# Altium footprint library Connectors SMD.PcbLib: 130 footprints (part 2 of 12) (continued)
## ERNI_294139 [mm] "50 Contacts Pitch 0.8  SMT Vertical Male Connector Type MicroCon"
height 4.8
pads (54):
  rect 0.55x2.35 smd: A1(9.6,-1.325) A2(8.8,-1.325) A3(8,-1.325) A4(7.2,-1.325) A5(6.4,-1.325) A6(5.6,-1.325) A7(4.8,-1.325) A8(4,-1.325) A9(3.2,-1.325) A10(2.4,-1.325) A11(1.6,-1.325) A12(0.8,-1.325) A13(0,-1.325) A14(-0.8,-1.325) A15(-1.6,-1.325) A16(-2.4,-1.325) A17(-3.2,-1.325) A18(-4,-1.325) A19(-4.8,-1.325) A20(-5.6,-1.325) A21(-6.4,-1.325) A22(-7.2,-1.325) A23(-8,-1.325) A24(-8.8,-1.325) A25(-9.6,-1.325) B1(9.6,1.325) B2(8.8,1.325) B3(8,1.325) B4(7.2,1.325) B5(6.4,1.325) B6(5.6,1.325) B7(4.8,1.325) B8(4,1.325) B9(3.2,1.325) B10(2.4,1.325) B11(1.6,1.325) B12(0.8,1.325) B13(0,1.325) B14(-0.8,1.325) B15(-1.6,1.325) B16(-2.4,1.325) B17(-3.2,1.325) B18(-4,1.325) B19(-4.8,1.325) B20(-5.6,1.325) B21(-6.4,1.325) B22(-7.2,1.325) B23(-8,1.325) B24(-8.8,1.325) B25(-9.6,1.325)
  rect 0.6x0.6 smd: MEC1(-11.8,0) MEC2(11.8,0)
  round 0.5 hole 0.8 unplated mask+0.15: Mec5(10.6,-0.625)
  round 0.5 hole 1 unplated mask+0.25: Mec6(-10.6,-0.625)
Top Layer:
  region: -12.1,-2.5 -10.75,-2.5 -10.75,-1.513 -10.835,-1.502 -11.054,-1.411 -11.242,-1.267 -11.386,-1.079 -11.477,-0.86 -11.508,-0.625 -11.477,-0.39 -11.386,-0.171 -11.242,0.017 -11.054,0.161 -10.835,0.252 -10.75,0.263 -10.75,0.262 -10.75,2.5 -12.1,2.5
  region: 10.75,-2.5 12.1,-2.5 12.1,2.5 10.75,2.5 10.75,0.263 10.835,0.252 11.054,0.161 11.242,0.017 11.386,-0.171 11.477,-0.39 11.508,-0.625 11.477,-0.86 11.386,-1.079 11.242,-1.267 11.054,-1.411 10.835,-1.502 10.75,-1.513 10.75,-1.512
Top Overlay:
  circle w0.25: c9.625,-3.101 r0.125
  text "a" at 12.525,-1.705 h1
  text "b" at 12.55,1 h1
Mechanical 8:
  drawing of 377 lines, arcs and shapes, not listed
Mechanical 14:
  drawing of 256 lines, arcs and shapes, not listed
  text "a" at 12.525,-1.705 h1
  text "b" at 12.55,1 h1
Mechanical 15:
  lines w0.05: -12.35,-2.75 -12.35,2.75 12.35,2.75 12.35,-2.75 -12.35,-2.75
3D body: height 4.8, standoff -0.7, extent -12.1,-2.5 12.1,2.5

## FCI_10030570-2112LF [mm] "26 Contacts, Pitch 1mm, Surface Mount Card Edge ExpressCard Module Connector"
height 2.13
pads (26):
  rect 0.7x2 smd: 1(12.5,0) 2(11.5,0) 3(10.5,0) 4(9.5,0) 5(8.5,0) 6(7.5,0) 7(6.5,0) 8(5.5,0) 9(4.5,0) 10(3.5,0) 11(2.5,0) 12(1.5,0) 13(0.5,0) 14(-0.5,0) 15(-1.5,0) 16(-2.5,0) 17(-3.5,0) 18(-4.5,0) 19(-5.5,0) 20(-6.5,0) 21(-7.5,0) 22(-8.5,0) 23(-9.5,0) 24(-10.5,0) 25(-11.5,0) 26(-12.5,0)
Top Overlay:
  circle w0.25: c12.5,1.8 r0.125
  lines w0.2: -15.55,-7.25 -12.55,-7.25 -12.55,-7.95 ccw(c-12.25,-7.95) -12.25,-8.25 12.25,-8.25 ccw(c12.25,-7.95) 12.55,-7.95 12.55,-7.25 15.55,-7.25 ; -15.55,0.75 -15.55,-0.5 ; -15.15,-7.25 -15.15,-6 ; -15.15,-0.5 -15.15,0.75 ; -14.935,-10.25 cw(c-14.935,-10.05) -15.108,-10.15 -15.5,-9.471 cw(c-15.161,-9.278) -15.55,-9.25 -15.55,-6 ; -13.5,-2.65 13.5,-2.65 ; -12.55,-7.75 12.55,-7.75 ; -11.4,-2.15 -11.4,-3.15 -13.5,-3.15 -13.5,-1 ; -10.6,-2.15 -10.6,-3.15 10.6,-3.15 10.6,-2.15 ; 11.4,-2.15 11.4,-3.15 13.5,-3.15 13.5,-1 ; 14.935,-10.25 ccw(c14.935,-10.05) 15.108,-10.15 15.5,-9.471 ccw(c15.161,-9.278) 15.55,-9.25 15.55,-6 ; 15.15,-7.25 15.15,-6 ; 15.15,-0.5 15.15,0.75 ; 15.55,0.75 15.55,-0.5 ; -15.55,-6 -14.7,-6 -14.7,-0.5 -15.55,-0.5 ; -15.55,-6 -15.55,-0.5 ; -13.5,-1 ccw(c-13.25,-1) -13.25,-1.25 -13.2,-1.25 -13.2,-2.15 13.2,-2.15 13.2,-1.25 13.25,-1.25 ccw(c13.25,-1) 13.5,-1 ; -13.5,-1 -13.5,0.75 -17,0.75 -17,-9.33 ccw(c-16.8,-9.33) -16.973,-9.43 -16.558,-10.15 ccw(c-16.385,-10.05) -16.385,-10.25 16.385,-10.25 ccw(c16.385,-10.05) 16.558,-10.15 16.973,-9.43 ccw(c16.8,-9.33) 17,-9.33 17,0.75 13.5,0.75 13.5,-1 ; 15.55,-6 15.55,-0.5 ; 15.55,-6 14.7,-6 14.7,-0.5 15.55,-0.5
Keep-Out Layer:
  board cut-out: -19.55,-10.5 -19.55,1 -15.2,1 -15.2,-7.05 -14.3,-7.05 -14.3,-1.85 -14.312,-1.85 -14.265,-1.616 -14.133,-1.417 -13.934,-1.285 -13.7,-1.238 -13.7,-1.25 13.7,-1.238 13.934,-1.285 14.133,-1.417 14.265,-1.616 14.312,-1.85 14.3,-1.85 14.3,-7.05 15.2,-7.05 15.2,1 19.55,1 19.55,-10.5
Mechanical 1:
  lines w0.635: -15.2,1 -15.2,-7.05 -14.3,-7.05 -14.3,-1.85 cw(c-13.7,-1.85) -13.7,-1.25 13.7,-1.25 cw(c13.7,-1.85) 14.3,-1.85 14.3,-7.05 15.2,-7.05 15.2,1
Mechanical 8:
  drawing of 186 lines, arcs and shapes, not listed
Mechanical 14:
  lines w0.1: -15.55,-7.25 -12.55,-7.25 -12.55,-7.95 ccw(c-12.25,-7.95) -12.25,-8.25 12.25,-8.25 ccw(c12.25,-7.95) 12.55,-7.95 12.55,-7.25 15.55,-7.25 ; -15.55,0.75 -15.55,-0.5 ; -15.15,-7.25 -15.15,-6 ; -15.15,-0.5 -15.15,0.75 ; -14.935,-10.25 cw(c-14.935,-10.05) -15.108,-10.15 -15.5,-9.471 cw(c-15.161,-9.278) -15.55,-9.25 -15.55,-6 ; -13.5,-2.65 13.5,-2.65 ; -12.55,-7.75 12.55,-7.75 ; -11.4,-2.15 -11.4,-3.15 -13.5,-3.15 -13.5,-1 ; -10.6,-2.15 -10.6,-3.15 10.6,-3.15 10.6,-2.15 ; 11.4,-2.15 11.4,-3.15 13.5,-3.15 13.5,-1 ; 14.935,-10.25 ccw(c14.935,-10.05) 15.108,-10.15 15.5,-9.471 ccw(c15.161,-9.278) 15.55,-9.25 15.55,-6 ; 15.15,-7.25 15.15,-6 ; 15.15,-0.5 15.15,0.75 ; 15.55,0.75 15.55,-0.5 ; -15.55,-6 -14.7,-6 -14.7,-0.5 -15.55,-0.5 ; -15.55,-6 -15.55,-0.5 ; -13.5,-1 ccw(c-13.25,-1) -13.25,-1.25 -13.2,-1.25 -13.2,-2.15 13.2,-2.15 13.2,-1.25 13.25,-1.25 ccw(c13.25,-1) 13.5,-1 ; -13.5,-1 -13.5,0.75 -17,0.75 -17,-9.33 ccw(c-16.8,-9.33) -16.973,-9.43 -16.558,-10.15 ccw(c-16.385,-10.05) -16.385,-10.25 16.385,-10.25 ccw(c16.385,-10.05) 16.558,-10.15 16.973,-9.43 ccw(c16.8,-9.33) 17,-9.33 17,0.75 13.5,0.75 13.5,-1 ; 15.55,-6 15.55,-0.5 ; 15.55,-6 14.7,-6 14.7,-0.5 15.55,-0.5
Mechanical 15:
  lines w0.05: -17.25,-10.5 -17.25,1.25 17.25,1.25 17.25,-10.5 -17.25,-10.5
Drill Drawing:
  lines w0.1: -15.2,0 -15.2,2 ; -14.3,-5.45 -14.3,-3.45 ; -14.26,0.658 -15.2,1 ; -14.26,1.342 -15.2,1 ; -13.702,-2.332 -14.124,-1.426 ; -13.36,-4.792 -14.3,-4.45 ; -13.36,-4.108 -14.3,-4.45 ; -13.218,-1.848 -14.124,-1.426 ; -11.2,-2.877 -12.673,-2.877 -14.124,-1.426 ; -4.1,1 -15.2,1 ; 3.116,1 15.2,1 ; 8.174,-4.45 -14.3,-4.45 ; 10.438,-7.05 13.7,-7.05 ; 10.438,-1.25 13.7,-1.25 ; 11.095,-6.11 11.438,-7.05 ; 11.095,-2.19 11.438,-1.25 ; 11.78,-6.11 11.438,-7.05 ; 11.78,-2.19 11.438,-1.25 ; 12.26,-4.45 14.3,-4.45 ; 13.36,-4.792 14.3,-4.45 ; 13.36,-4.108 14.3,-4.45 ; 14.26,0.658 15.2,1 ; 14.26,1.342 15.2,1 ; 14.3,-5.45 14.3,-3.45 ; 15.2,0 15.2,2 ; 15.8,-7.05 19.663,-7.05 ; 15.8,1 19.663,1 ; 18.32,-6.11 18.663,-7.05 ; 18.32,0.06 18.663,1 ; 19.005,-6.11 18.663,-7.05 ; 19.005,0.06 18.663,1 ; 11.438,-7.05 11.438,-1.25 ; 18.663,-7.05 18.663,1
  text "r0.6" at -8.4,-2.4 h1
  text "5.8" at 11.05,-5.8 h1
  text "-0.1" at 10.148,-3.709 h1
  text "+0" at 8.823,-3.734 h1
  text "28.6" at 2.2,-4.825 h1
  text "-0.05" at -0.827,-5.539 h1
  text "+" at -0.827,-6.311 h1
  text "30.4" at 2.65,1.65 h1
  text "-0.1" at -0.493,0.947 h1
  text "+" at -0.493,0.15 h1
  text "8.05" at 18.425,-5.225 h1
  text "-0.1" at 17.9,-2 h1
  text "+0" at 16.6,-2 h1
3D body: height 2.33, standoff -2.67, extent -17,-10.25 17,0.75

## FCI_10058937-100ABTLF [mm] "26 Contacts, Pitch 1mm, Surface Mount ExpressCard Host Connector"
height 5.5
pads (28):
  rect 0.7x2 smd: 1(-12.5,0) 2(-11.5,0) 3(-10.5,0) 4(-9.5,0) 5(-8.5,0) 6(-7.5,0) 7(-6.5,0) 8(-5.5,0) 9(-4.5,0) 10(-3.5,0) 11(-2.5,0) 12(-1.5,0) 13(-0.5,0) 14(0.5,0) 15(1.5,0) 16(2.5,0) 17(3.5,0) 18(4.5,0) 19(5.5,0) 20(6.5,0) 21(7.5,0) 22(8.5,0) 23(9.5,0) 24(10.5,0) 25(11.5,0) 26(12.5,0)
  round 1 hole 2 unplated mask+0.5: Mec1(-17.1,-3.5)
  round 1 hole 1.6 unplated mask+0.3: Mec2(17.1,-3.5)
Top Layer keep-out:
  region: -19.2,-0.8 -13.2,-0.8 -13.2,-1.3 13.2,-1.3 13.2,-0.8 19.2,-0.8 19.2,-11.75 -19.2,-11.75
Top Overlay:
  drawing of 182 lines, arcs and shapes, not listed
Mechanical 8:
  drawing of 174 lines, arcs and shapes, not listed
Mechanical 14:
  drawing of 181 lines, arcs and shapes, not listed
Mechanical 15:
  lines w0.05: -19.35,-14.9 19.35,-14.9 19.35,1.25 -19.35,1.25 -19.35,-14.9
3D body: height 5.5, standoff -0.9, extent -19.55,-14.65 19.1,0.604

## FCI_10061913-103TLF [mm] "164 Positions PCI Express Surface Mount Card Edge Connector"
height 11.1
pads (168):
  rect 0.7x2 smd: A1(-41.5,3.6) A2(-40.5,3.6) A3(-39.5,3.6) A4(-38.5,3.6) A5(-37.5,3.6) A6(-36.5,3.6) A7(-35.5,3.6) A8(-34.5,3.6) A9(-33.5,3.6) A10(-32.5,3.6) A11(-31.5,3.6) A12(-28.5,3.6) A13(-27.5,3.6) A14(-26.5,3.6) A15(-25.5,3.6) A16(-24.5,3.6) A17(-23.5,3.6) A18(-22.5,3.6) A19(-21.5,3.6) A20(-20.5,3.6) A21(-19.5,3.6) A22(-18.5,3.6) A23(-17.5,3.6) A24(-16.5,3.6) A25(-15.5,3.6) A26(-14.5,3.6) A27(-13.5,3.6) A28(-12.5,3.6) A29(-11.5,3.6) A30(-10.5,3.6) A31(-9.5,3.6) A32(-8.5,3.6) A33(-7.5,3.6) A34(-6.5,3.6) A35(-5.5,3.6) A36(-4.5,3.6) A37(-3.5,3.6) A38(-2.5,3.6) A39(-1.5,3.6) A40(-0.5,3.6) A41(0.5,3.6) A42(1.5,3.6) A43(2.5,3.6) A44(3.5,3.6) A45(4.5,3.6) A46(5.5,3.6) A47(6.5,3.6) A48(7.5,3.6) A49(8.5,3.6) A50(9.5,3.6) A51(10.5,3.6) A52(11.5,3.6) A53(12.5,3.6) A54(13.5,3.6) A55(14.5,3.6) A56(15.5,3.6) A57(16.5,3.6) A58(17.5,3.6) A59(18.5,3.6) A60(19.5,3.6) A61(20.5,3.6) A62(21.5,3.6) A63(22.5,3.6) A64(23.5,3.6) A65(24.5,3.6) A66(25.5,3.6) A67(26.5,3.6) A68(27.5,3.6) A69(28.5,3.6) A70(29.5,3.6) A71(30.5,3.6) A72(31.5,3.6) A73(32.5,3.6) A74(33.5,3.6) A75(34.5,3.6) A76(35.5,3.6) A77(36.5,3.6) A78(37.5,3.6) A79(38.5,3.6) A80(39.5,3.6) A81(40.5,3.6) A82(41.5,3.6) B1(-41.5,-3.6) B2(-40.5,-3.6) B3(-39.5,-3.6) B4(-38.5,-3.6) B5(-37.5,-3.6) B6(-36.5,-3.6) B7(-35.5,-3.6) B8(-34.5,-3.6) B9(-33.5,-3.6) B10(-32.5,-3.6) B11(-31.5,-3.6) B12(-28.5,-3.6) B13(-27.5,-3.6) B14(-26.5,-3.6) B15(-25.5,-3.6) B16(-24.5,-3.6) B17(-23.5,-3.6) B18(-22.5,-3.6) B19(-21.5,-3.6) B20(-20.5,-3.6) B21(-19.5,-3.6) B22(-18.5,-3.6) B23(-17.5,-3.6) B24(-16.5,-3.6) B25(-15.5,-3.6) B26(-14.5,-3.6) B27(-13.5,-3.6) B28(-12.5,-3.6) B29(-11.5,-3.6) B30(-10.5,-3.6) B31(-9.5,-3.6) B32(-8.5,-3.6) B33(-7.5,-3.6) B34(-6.5,-3.6) B35(-5.5,-3.6) B36(-4.5,-3.6) B37(-3.5,-3.6) B38(-2.5,-3.6) B39(-1.5,-3.6) B40(-0.5,-3.6) B41(0.5,-3.6) B42(1.5,-3.6) B43(2.5,-3.6) B44(3.5,-3.6) B45(4.5,-3.6) B46(5.5,-3.6) B47(6.5,-3.6) B48(7.5,-3.6) B49(8.5,-3.6) B50(9.5,-3.6) B51(10.5,-3.6) B52(11.5,-3.6) B53(12.5,-3.6) B54(13.5,-3.6) B55(14.5,-3.6) B56(15.5,-3.6) B57(16.5,-3.6) B58(17.5,-3.6) B59(18.5,-3.6) B60(19.5,-3.6) B61(20.5,-3.6) B62(21.5,-3.6) B63(22.5,-3.6) B64(23.5,-3.6) B65(24.5,-3.6) B66(25.5,-3.6) B67(26.5,-3.6) B68(27.5,-3.6) B69(28.5,-3.6) B70(29.5,-3.6) B71(30.5,-3.6) B72(31.5,-3.6) B73(32.5,-3.6) B74(33.5,-3.6) B75(34.5,-3.6) B76(35.5,-3.6) B77(36.5,-3.6) B78(37.5,-3.6) B79(38.5,-3.6) B80(39.5,-3.6) B81(40.5,-3.6) B82(41.5,-3.6)
  rect 3x5 smd: MECH1(-44.5,0) MECH2(44.5,0)
  round 1 hole 1.2 unplated mask+0.1: POS1(-29.85,0) POS2(43.3,0)
Top Overlay:
  lines w0.2: -44.505,-2.9 -44.505,-3.725 ; -44.505,2.9 -44.505,3.725 -42.25,3.725 ; -42.25,-3.725 -44.505,-3.725 ; -40.505,-3.725 -40.505,-5.075 -44.505,-5.075 -44.505,-3.725 ; -39.505,-3.725 -39.505,-5.075 -35.505,-5.075 -35.505,-3.725 ; -34.505,-3.725 -34.505,-5.075 -30.505,-5.075 -30.505,-3.725 ; -30.75,-3.725 -29.25,-3.725 ; -30.75,3.725 -29.25,3.725 ; -29.505,-3.725 -29.505,-5.075 -25.505,-5.075 -25.505,-3.725 ; -29.115,-0.678 -29.115,-0.9 42.535,-0.9 42.535,-0.644 ; -29.115,0.678 -29.115,0.9 42.535,0.9 42.535,0.644 ; -24.505,-3.725 -24.505,-5.075 -20.505,-5.075 -20.505,-3.725 ; -19.505,-3.725 -19.505,-5.075 -15.505,-5.075 -15.505,-3.725 ; -14.505,-3.725 -14.505,-5.075 -10.505,-5.075 -10.505,-3.725 ; -9.505,-3.725 -9.505,-5.075 -5.505,-5.075 -5.505,-3.725 ; -4.505,-3.725 -4.505,-5.075 -0.505,-5.075 -0.505,-3.725 ; 0.495,-3.725 0.495,-5.075 4.495,-5.075 4.495,-3.725 ; 5.495,-3.725 5.495,-5.075 9.495,-5.075 9.495,-3.725 ; 10.495,-3.725 10.495,-5.075 14.495,-5.075 14.495,-3.725 ; 15.495,-3.725 15.495,-5.075 19.495,-5.075 19.495,-3.725 ; 20.495,-3.725 20.495,-5.075 24.495,-5.075 24.495,-3.725 ; 25.495,-3.725 25.495,-5.075 29.495,-5.075 29.495,-3.725 ; 30.495,-3.725 30.495,-5.075 34.495,-5.075 34.495,-3.725 ; 35.495,-3.725 35.495,-5.075 39.495,-5.075 39.495,-3.725 ; 40.495,-3.725 40.503,-5.08 44.495,-5.08 44.495,-2.9 ; 42.25,-3.725 44.495,-3.725 ; 42.25,3.725 44.495,3.725 44.495,2.9 ; -42.545,-0.9 -42.545,0.9 -30.895,0.9 -30.895,-0.9 -42.545,-0.9
Mechanical 8:
  drawing of 190 lines, arcs and shapes, not listed
Mechanical 14:
  lines w0.1: -44.505,-1.975 -45.505,-1.975 -45.505,2.025 -44.505,2.025 ; -40.505,-3.725 -40.505,-5.075 -44.505,-5.075 -44.505,-3.725 ; -39.505,-3.725 -39.505,-5.075 -35.505,-5.075 -35.505,-3.725 ; -34.505,-3.725 -34.505,-5.075 -30.505,-5.075 -30.505,-3.725 ; -29.505,-3.725 -29.505,-5.075 -25.505,-5.075 -25.505,-3.725 ; -24.505,-3.725 -24.505,-5.075 -20.505,-5.075 -20.505,-3.725 ; -19.505,-3.725 -19.505,-5.075 -15.505,-5.075 -15.505,-3.725 ; -14.505,-3.725 -14.505,-5.075 -10.505,-5.075 -10.505,-3.725 ; -9.505,-3.725 -9.505,-5.075 -5.505,-5.075 -5.505,-3.725 ; -4.505,-3.725 -4.505,-5.075 -0.505,-5.075 -0.505,-3.725 ; 0.495,-3.725 0.495,-5.075 4.495,-5.075 4.495,-3.725 ; 5.495,-3.725 5.495,-5.075 9.495,-5.075 9.495,-3.725 ; 10.495,-3.725 10.495,-5.075 14.495,-5.075 14.495,-3.725 ; 15.495,-3.725 15.495,-5.075 19.495,-5.075 19.495,-3.725 ; 20.495,-3.725 20.495,-5.075 24.495,-5.075 24.495,-3.725 ; 25.495,-3.725 25.495,-5.075 29.495,-5.075 29.495,-3.725 ; 30.495,-3.725 30.495,-5.075 34.495,-5.075 34.495,-3.725 ; 35.495,-3.725 35.495,-5.075 39.495,-5.075 39.495,-3.725 ; 40.495,-3.725 40.503,-5.08 44.495,-5.08 44.495,3.725 -44.505,3.725 -44.505,-3.725 ; 44.495,-3.725 -44.505,-3.725 ; 44.495,-1.975 45.495,-1.975 45.495,2.025 44.495,2.025 ; -42.545,-0.9 -42.545,0.9 -30.895,0.9 -30.895,-0.9 -42.545,-0.9 ; -29.115,-0.9 -29.115,0.9 42.535,0.9 42.535,-0.9 -29.115,-0.9
Mechanical 15:
  lines w0.05: -46.25,-5.33 46.25,-5.33 46.25,4.85 -46.25,4.85 -46.25,-5.33
3D body: height 11.1, standoff -0.9, extent -45.505,-5.075 45.495,4.125

## HIROSE_DF13-9P-1.25H(21) [mm] "Pitch 1.25mm, Single Row, 9 Contacts, Right Angle SMT Header, Series DF13"
height 3.6
pads (11):
  rect 0.7x1.8 smd: 1(5,3.5) 2(3.75,3.5) 3(2.5,3.5) 4(1.25,3.5) 5(0,3.5) 6(-1.25,3.5) 7(-2.5,3.5) 8(-3.75,3.5) 9(-5,3.5)
  rect 1.6x2.2 smd: MEC1(-7.35,0.2) MEC2(7.35,0.2)
Top Overlay:
  circle w0.25: c6.125,3.376 r0.125
  lines w0.2: -7.2,-1.2 -7.2,-1.5 -6.45,-1.5 ; -7.2,1.6 -7.2,1.9 -6.45,1.9 ; -6.45,-1.2 -6.45,-2.5 6.45,-2.5 6.45,-1.2 ; -6.45,1.6 -6.45,2.5 -5.75,2.5 ; 5.75,2.5 6.45,2.5 6.45,1.6 ; 6.45,-1.5 7.2,-1.5 7.2,-1.2 ; 6.45,1.9 7.2,1.9 7.2,1.6
Mechanical 8:
  lines w0.1: -7.85,0.2 -7.35,0.2 ; -7.35,-0.3 -7.35,0.2 ; -7.35,0.7 -7.35,0.2 ; -6.85,0.2 -7.35,0.2 ; -5.5,3.5 -5,3.5 ; -5,3 -5,3.5 ; -5,4 -5,3.5 ; -4.5,3.5 -5,3.5 ; -4.25,3.5 -3.75,3.5 ; -3.75,3 -3.75,3.5 ; -3.75,4 -3.75,3.5 ; -3.25,3.5 -3.75,3.5 ; -3,3.5 -2.5,3.5 ; -2.5,3 -2.5,3.5 ; -2.5,4 -2.5,3.5 ; -2,3.5 -2.5,3.5 ; -1.75,3.5 -1.25,3.5 ; -1.25,3 -1.25,3.5 ; -1.25,4 -1.25,3.5 ; -0.75,3.5 -1.25,3.5 ; -0.5,0 0,0 ; -0.5,3.5 0,3.5 ; 0,-0.5 0,0 ; 0,0.5 0,0 ; 0,3 0,3.5 ; 0,4 0,3.5 ; 0.5,0 0,0 ; 0.5,3.5 0,3.5 ; 0.75,3.5 1.25,3.5 ; 1.25,3 1.25,3.5 ; 1.25,4 1.25,3.5 ; 1.75,3.5 1.25,3.5 ; 2,3.5 2.5,3.5 ; 2.5,3 2.5,3.5 ; 2.5,4 2.5,3.5 ; 3,3.5 2.5,3.5 ; 3.25,3.5 3.75,3.5 ; 3.75,3 3.75,3.5 ; 3.75,4 3.75,3.5 ; 4.25,3.5 3.75,3.5 ; 4.5,3.5 5,3.5 ; 5,3 5,3.5 ; 5,4 5,3.5 ; 5.5,3.5 5,3.5 ; 6.85,0.2 7.35,0.2 ; 7.35,-0.3 7.35,0.2 ; 7.35,0.7 7.35,0.2 ; 7.85,0.2 7.35,0.2 ; -8.15,-0.9 -8.15,1.3 -6.55,1.3 -6.55,-0.9 -8.15,-0.9 ; -5.35,2.6 -4.65,2.6 -4.65,4.4 -5.35,4.4 -5.35,2.6 ; -4.1,2.6 -3.4,2.6 -3.4,4.4 -4.1,4.4 -4.1,2.6 ; -2.85,2.6 -2.15,2.6 -2.15,4.4 -2.85,4.4 -2.85,2.6 ; -1.6,2.6 -0.9,2.6 -0.9,4.4 -1.6,4.4 -1.6,2.6 ; -0.35,2.6 0.35,2.6 0.35,4.4 -0.35,4.4 -0.35,2.6 ; 0.9,2.6 1.6,2.6 1.6,4.4 0.9,4.4 0.9,2.6 ; 2.15,2.6 2.85,2.6 2.85,4.4 2.15,4.4 2.15,2.6 ; 3.4,2.6 4.1,2.6 4.1,4.4 3.4,4.4 3.4,2.6 ; 4.65,2.6 5.35,2.6 5.35,4.4 4.65,4.4 4.65,2.6 ; 6.55,-0.9 6.55,1.3 8.15,1.3 8.15,-0.9 6.55,-0.9
Mechanical 14:
  circle w0.25: c6.125,3.376 r0.125
  lines w0.1: -7.2,-0.7 -7.2,-1.5 -6.45,-1.5 ; -7.2,1.1 -7.2,1.9 -6.45,1.9 ; -6.653,1.1 -7.95,1.1 -7.95,-0.7 -6.65,-0.7 ; -6.45,-1.2 -6.95,-1.2 -6.95,-1 -6.65,-1 -6.65,1.4 -6.95,1.4 -6.95,1.6 -6.45,1.6 ; -5.175,2.5 -5.175,3.725 ; -4.825,2.5 -4.825,3.725 ; -3.925,2.5 -3.925,3.725 ; -3.575,2.5 -3.575,3.725 ; -2.675,2.5 -2.675,3.725 ; -2.325,2.5 -2.325,3.725 ; -1.425,2.5 -1.425,3.725 ; -1.075,2.5 -1.075,3.725 ; -0.175,2.5 -0.175,3.725 ; 0.175,2.5 0.175,3.725 ; 1.075,2.5 1.075,3.725 ; 1.425,2.5 1.425,3.725 ; 2.325,2.5 2.325,3.725 ; 2.675,2.5 2.675,3.725 ; 3.575,2.5 3.575,3.725 ; 3.925,2.5 3.925,3.725 ; 4.825,2.5 4.825,3.725 ; 5.175,2.5 5.175,3.725 ; 6.45,-1.5 7.2,-1.5 7.2,-0.7 ; 6.45,-1.2 6.95,-1.2 6.95,-1 6.65,-1 6.65,1.4 6.95,1.4 6.95,1.6 6.45,1.6 ; 6.45,1.9 7.2,1.9 7.2,1.1 ; 6.65,-0.7 7.95,-0.7 7.95,1.1 6.653,1.1 ; -5.175,3.725 -4.825,3.725 ; -5.175,3.725 -5.075,4 -4.925,4 -4.825,3.725 ; -3.925,3.725 -3.575,3.725 ; -3.925,3.725 -3.825,4 -3.675,4 -3.575,3.725 ; -2.675,3.725 -2.325,3.725 ; -2.675,3.725 -2.575,4 -2.425,4 -2.325,3.725 ; -1.425,3.725 -1.075,3.725 ; -1.425,3.725 -1.325,4 -1.175,4 -1.075,3.725 ; -0.175,3.725 0.175,3.725 ; -0.175,3.725 -0.075,4 0.075,4 0.175,3.725 ; 1.075,3.725 1.425,3.725 ; 1.075,3.725 1.175,4 1.325,4 1.425,3.725 ; 2.325,3.725 2.675,3.725 ; 2.325,3.725 2.425,4 2.575,4 2.675,3.725 ; 3.575,3.725 3.925,3.725 ; 3.575,3.725 3.675,4 3.825,4 3.925,3.725 ; 4.825,3.725 5.175,3.725 ; 4.825,3.725 4.925,4 5.075,4 5.175,3.725 ; -6.45,-2.5 -6.45,2.5 6.45,2.5 6.45,-2.5 -6.45,-2.5
Mechanical 15:
  lines w0.1: -8.4,-1.15 -7.45,-1.15 -7.45,-1.75 -6.7,-1.75 -6.7,-2.75 6.7,-2.75 6.7,-1.75 7.45,-1.75 7.45,-1.15 8.4,-1.15 8.4,1.55 7.45,1.55 7.45,2.15 6.7,2.15 6.7,2.75 5.6,2.75 5.6,4.65 -5.6,4.65 -5.6,2.75 -6.7,2.75 -6.7,2.15 -7.45,2.15 -7.45,1.55 -8.4,1.55 -8.4,-1.15
3D body: height 3.6, standoff 0, extent -7.95,-2.5 7.95,4

## HIROSE_FH12-30S-0.5SH(55) [mm] "30 Contacts, Pitch 0.5mm, Bottom Contact Type, Right Angled Surface Mount Connector for FPC/FCC, FH12 Serie"
height 2
pads (32):
  rect 0.3x1.5 smd: 1(-7.25,3.25) 2(-6.75,3.25) 3(-6.25,3.25) 4(-5.75,3.25) 5(-5.25,3.25) 6(-4.75,3.25) 7(-4.25,3.25) 8(-3.75,3.25) 9(-3.25,3.25) 10(-2.75,3.25) 11(-2.25,3.25) 12(-1.75,3.25) 13(-1.25,3.25) 14(-0.75,3.25) 15(-0.25,3.25) 16(0.25,3.25) 17(0.75,3.25) 18(1.25,3.25) 19(1.75,3.25) 20(2.25,3.25) 21(2.75,3.25) 22(3.25,3.25) 23(3.75,3.25) 24(4.25,3.25) 25(4.75,3.25) 26(5.25,3.25) 27(5.75,3.25) 28(6.25,3.25) 29(6.75,3.25) 30(7.25,3.25)
  rect 1.8x2.2 smd: MEC1(-9.15,0) MEC2(9.15,0)
Top Overlay:
  circle w0.25: c-7.975,3.8 r0.125
  lines w0.2: -9.05,-1.4 -9.05,-2 -8.45,-2 ; -9.05,1.4 -9.05,2.6 -7.7,2.6 ; -8.45,-1.4 -8.45,-2.3 -8.85,-2.3 -8.85,-3 8.85,-3 8.85,-2.3 8.45,-2.3 8.45,-1.4 ; -8.2,1.4 -8.2,2.6 ; -7.95,-0.2 -7.45,-0.2 -7.45,0.649 -7.95,0.649 ; -7.828,0.65 -7.828,0.8 -7.375,0.8 -7.375,0.2 7.375,0.2 7.375,0.8 7.673,0.8 7.673,0.65 ; -7.45,0.1 7.45,0.1 ; 7.7,2.6 9.05,2.6 9.05,1.4 ; 7.95,-0.2 7.45,-0.2 7.45,0.65 7.95,0.65 ; 8.2,1.4 8.2,2.6 ; 8.45,-2 9.05,-2 9.05,-1.4
Mechanical 8:
  drawing of 231 lines, arcs and shapes, not listed
Mechanical 14:
  drawing of 218 lines, arcs and shapes, not listed
Mechanical 15:
  lines w0.05: -10.3,-3.25 -10.3,4.15 10.3,4.15 10.3,-3.25 -10.3,-3.25
3D body: height 2.05, standoff 0, extent -9.55,-3 9.55,3.4

## HIROSE_FH41-40S-0.5SH(05) [mm] "40 Contacts, 0.5mm Pitch, 2.5mm, Horizontal Mounting, High Speed Transmission Connector for Shielded FFC, FH41 Serie"
height 2.5
pads (50):
  rect 0.3x0.65 smd: 1(9.75,-3.1) 2(9.25,-3.1) 3(8.75,-3.1) 4(8.25,-3.1) 5(7.75,-3.1) 6(7.25,-3.1) 7(6.75,-3.1) 8(6.25,-3.1) 9(5.75,-3.1) 10(5.25,-3.1) 11(4.75,-3.1) 12(4.25,-3.1) 13(3.75,-3.1) 14(3.25,-3.1) 15(2.75,-3.1) 16(2.25,-3.1) 17(1.75,-3.1) 18(1.25,-3.1) 19(0.75,-3.1) 20(0.25,-3.1) 21(-0.25,-3.1) 22(-0.75,-3.1) 23(-1.25,-3.1) 24(-1.75,-3.1) 25(-2.25,-3.1) 26(-2.75,-3.1) 27(-3.25,-3.1) 28(-3.75,-3.1) 29(-4.25,-3.1) 30(-4.75,-3.1) 31(-5.25,-3.1) 32(-5.75,-3.1) 33(-6.25,-3.1) 34(-6.75,-3.1) 35(-7.25,-3.1) 36(-7.75,-3.1) 37(-8.25,-3.1) 38(-8.75,-3.1) 39(-9.25,-3.1) 40(-9.75,-3.1)
  rect 0.4x1.55 smd: 41(11,2.15) 42(-11,2.15)
  rect 0.3x1.2 smd: G1(8.75,2.575) G2(6.25,2.575) G3(3.75,2.575) G4(1.25,2.575) G5(-1.25,2.575) G6(-3.75,2.575) G7(-6.25,2.575) G8(-8.75,2.575)
Top Overlay:
  drawing of 200 lines, arcs and shapes, not listed
Mechanical 8:
  drawing of 304 lines, arcs and shapes, not listed
Mechanical 14:
  drawing of 343 lines, arcs and shapes, not listed
Mechanical 15:
  lines w0.05: -12.25,-3.675 -12.25,3.175 12.25,3.175 12.25,-3.675 -12.25,-3.675
3D body: height 2.5, standoff 0, extent -12,-3.225 12,3.025

## HIROSE_FH48-40S-0.5SV [mm] "40 Contacts, 0.5mm Pitch, 2.5mm,Vertical Entry, High Speed Transmission Connector for Shielded FFC"
height 2.5
pads (48):
  rect 0.3x1.63 smd: 1(9.75,-1.785) 2(9.25,-1.785) 3(8.75,-1.785) 4(8.25,-1.785) 5(7.75,-1.785) 6(7.25,-1.785) 7(6.75,-1.785) 8(6.25,-1.785) 9(5.75,-1.785) 10(5.25,-1.785) 11(4.75,-1.785) 12(4.25,-1.785) 13(3.75,-1.785) 14(3.25,-1.785) 15(2.75,-1.785) 16(2.25,-1.785) 17(1.75,-1.785) 18(1.25,-1.785) 19(0.75,-1.785) 20(0.25,-1.785) 21(-0.25,-1.785) 22(-0.75,-1.785) 23(-1.25,-1.785) 24(-1.75,-1.785) 25(-2.25,-1.785) 26(-2.75,-1.785) 27(-3.25,-1.785) 28(-3.75,-1.785) 29(-4.25,-1.785) 30(-4.75,-1.785) 31(-5.25,-1.785) 32(-5.75,-1.785) 33(-6.25,-1.785) 34(-6.75,-1.785) 35(-7.25,-1.785) 36(-7.75,-1.785) 37(-8.25,-1.785) 38(-8.75,-1.785) 39(-9.25,-1.785) 40(-9.75,-1.785)
  rect 0.3x1.2 smd: G1(8.75,2) G2(6.25,2) G3(3.75,2) G4(1.25,2) G5(-1.25,2) G6(-3.75,2) G7(-6.25,2) G8(-8.75,2)
Top Overlay:
  circle w0.25: c11.927,-4.086 r0.125
  lines w0.2: -11.275,-1.72 -11.275,-4.37 -10.185,-4.37 ; -10.935,-0.3 -10.485,-0.3 -10.285,-0.1 -10.285,0.95 ; -10.935,0.384 -10.285,0.384 ; -10.385,-0.2 10.398,-0.2 ; -10.285,0.22 10.285,0.22 ; -10.285,0.52 10.285,0.52 ; -10.185,-3.92 -5.185,-3.92 ; -10.185,-2.9 -10.185,-4.37 ; -10.185,-0.67 -10.185,-0.2 ; -9.25,1.53 -11.535,1.53 -11.535,0.58 -12.5,0.58 -12.5,-1.72 -10.935,-1.72 -10.935,0.95 10.935,0.95 10.935,-1.72 12.5,-1.72 12.5,0.58 11.535,0.58 11.535,1.53 9.25,1.53 ; -8.25,1.53 -6.75,1.53 ; -5.75,1.53 -4.25,1.53 ; -3.25,1.53 -1.75,1.53 ; -0.75,1.53 0.75,1.53 ; 1.75,1.53 3.25,1.53 ; 4.25,1.53 5.75,1.53 ; 6.75,1.53 8.25,1.53 ; 10.185,-3.92 5.185,-3.92 ; 10.185,-2.9 10.185,-4.37 ; 10.185,-0.67 10.185,-0.2 ; 10.285,0.384 10.935,0.384 ; 10.285,0.95 10.285,-0.1 10.485,-0.3 10.935,-0.3 ; 11.275,-1.72 11.275,-4.37 10.185,-4.37 ; -10.185,-4.37 -10.185,-4.42 -5.185,-4.42 -5.185,-3.92 ; -5.185,-3.92 5.185,-3.92 ; 5.185,-3.92 5.185,-4.42 10.185,-4.42 10.185,-4.37
Mechanical 8:
  drawing of 292 lines, arcs and shapes, not listed
Mechanical 14:
  circle w0.25: c11.927,-4.086 r0.125
  lines w0.1: -11.275,-1.72 -11.275,-4.37 -10.185,-4.37 ; -10.935,-0.3 -10.485,-0.3 -10.285,-0.1 -10.285,0.95 ; -10.935,0.384 -10.285,0.384 ; -10.385,-0.2 10.398,-0.2 ; -10.285,0.22 10.285,0.22 ; -10.285,0.52 10.285,0.52 ; -10.185,-3.92 -5.185,-3.92 ; -10.185,-0.2 -10.185,-4.37 ; -8.81,2.05 -8.81,2.35 -8.69,2.35 -8.69,2.05 ; -6.31,2.05 -6.31,2.35 -6.19,2.35 -6.19,2.05 ; -3.81,2.05 -3.81,2.35 -3.69,2.35 -3.69,2.05 ; -1.31,2.05 -1.31,2.35 -1.19,2.35 -1.19,2.05 ; 1.19,2.05 1.19,2.35 1.31,2.35 1.31,2.05 ; 3.69,2.05 3.69,2.35 3.81,2.35 3.81,2.05 ; 6.19,2.05 6.19,2.35 6.31,2.35 6.31,2.05 ; 8.69,2.05 8.69,2.35 8.81,2.35 8.81,2.05 ; 10.185,-3.92 5.185,-3.92 ; 10.185,-0.2 10.185,-4.37 ; 10.285,0.384 10.935,0.384 ; 10.285,0.95 10.285,-0.1 10.485,-0.3 10.935,-0.3 ; 11.275,-1.72 11.275,-4.37 10.185,-4.37 ; -10.185,-4.37 -10.185,-4.42 -5.185,-4.42 -5.185,-3.92 ; -5.185,-3.92 5.185,-3.92 ; 5.185,-3.92 5.185,-4.42 10.185,-4.42 10.185,-4.37 ; -12.5,-1.72 -12.5,0.58 -11.535,0.58 -11.535,1.53 -9.25,1.53 -9.25,2.05 -8.25,2.05 -8.25,1.53 -6.75,1.53 -6.75,2.05 -5.75,2.05 -5.75,1.53 -4.25,1.53 -4.25,2.05 -3.25,2.05 -3.25,1.53 -1.75,1.53 -1.75,2.05 -0.75,2.05 -0.75,1.53 0.75,1.53 0.75,2.05 1.75,2.05 1.75,1.53 3.25,1.53 3.25,2.05 4.25,2.05 4.25,1.53 5.75,1.53 5.75,2.05 6.75,2.05 6.75,1.53 8.25,1.53 8.25,2.05 9.25,2.05 9.25,1.53 11.535,1.53 11.535,0.58 12.5,0.58 12.5,-1.72 10.935,-1.72 10.935,0.95 -10.935,0.95 -10.935,-1.72 -12.5,-1.72
Mechanical 15:
  lines w0.05: -12.75,-4.67 12.75,-4.67 12.75,2.85 -12.75,2.85 -12.75,-4.67
3D body: height 6.18, standoff 0, extent -12.5,-4.42 12.5,2.35